# Altium integrated library Lattice CPLD ispLSI.IntLib: 471 symbols (part 14 of 26) (continued)
## ispLSI3160-125LB272 (continued)
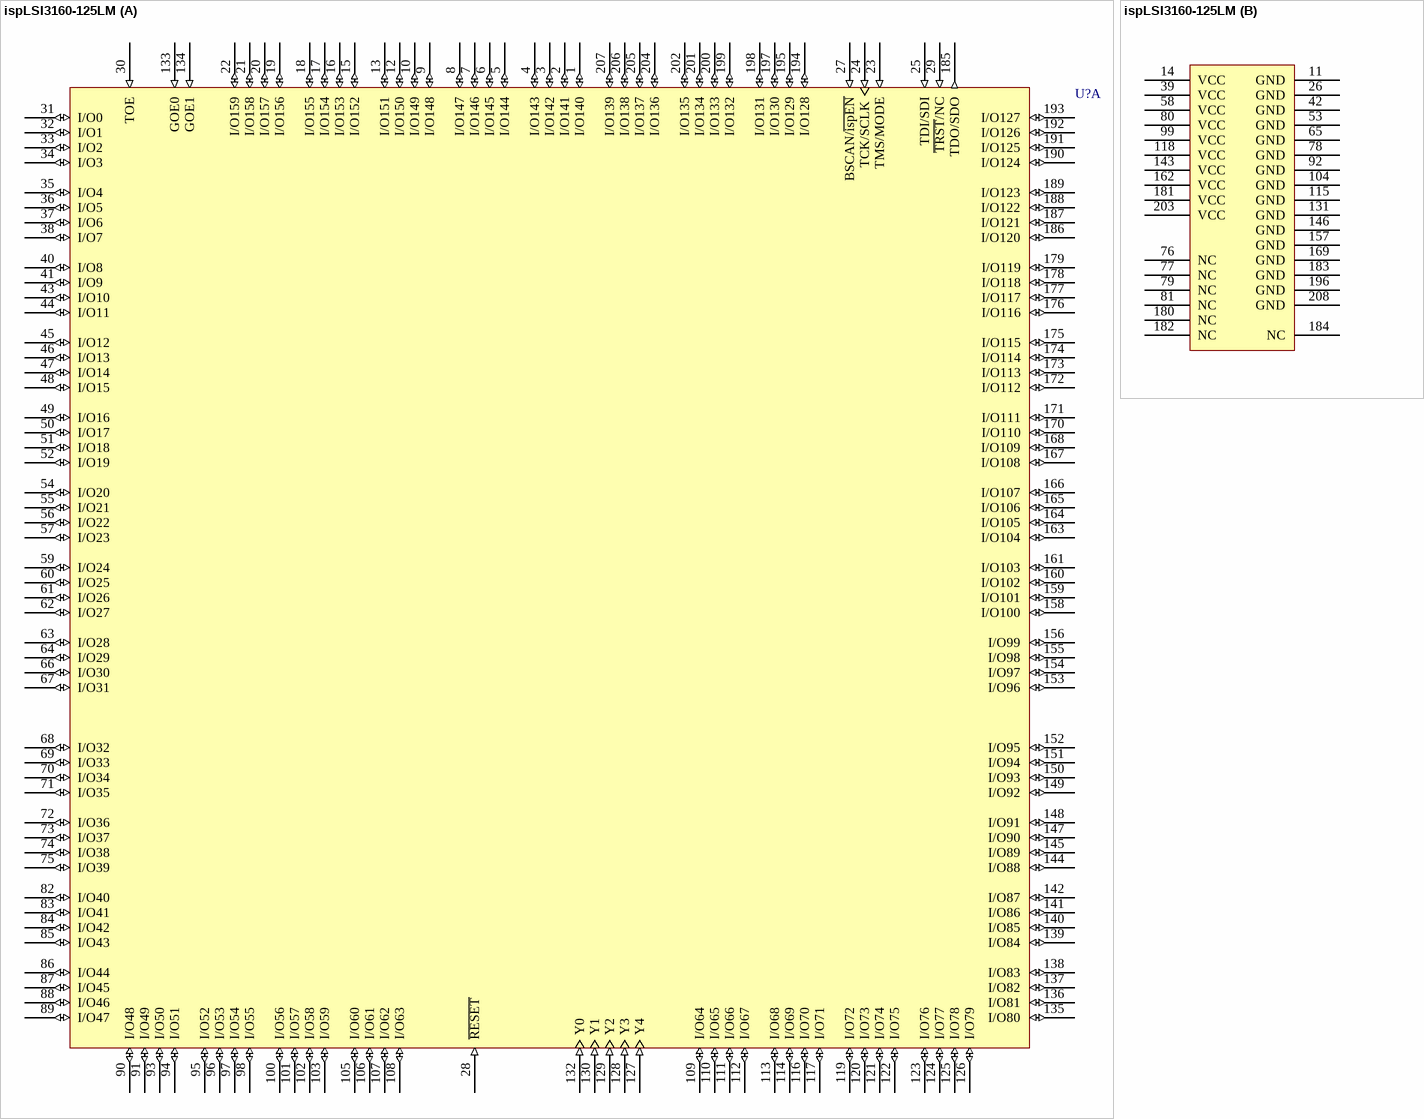
[diagram p123: symbol ispLSI3160-125LM]

## ispLSI3160-125LM
designator U?
In-System Programmable High-Density PLD; Published: 23-Sep-2002; LatestRevisionDate: 13-Apr-2006; LatestRevisionNote: IPC-7351 Footprint Added.; DatasheetVersion: May-1999; PackageVersion: Sep-2000; PackageReference: MQFP208; Publisher: Altium Limited; PackageDescription: 208-Pin Shrink Quad Flat Pack 0.5 mm Pitch; ComponentLink1Description: Manufacturer Link; ComponentLink1URL: http://www.latticesemi.com/products/mature/index.cfm; ComponentLink2Description: Datasheet; ComponentLink2URL: http://www.latticesemi.com/lit/docs/datasheets/cpld/3160.pdf
footprint MQFP208_N (Shrink QFP, 208-Leads, Body 27.7x27.7mm, Pitch 0.5mm, IPC Medium Density)
footprint MQFP208_L (Shrink QFP, 208-Leads, Body 27.7x27.7mm, Pitch 0.5mm, IPC High Density)
footprint MQFP208_M (Shrink QFP, 208-Leads, Body 27.7x27.7mm, Pitch 0.5mm, IPC Low Density)
3D model 3160-MQFP208 (208-Pin Shrink Quad Flat Pack 0.5 mm Pitch)
part A pins: 1 I/O140 (io), 2 I/O141 (io), 3 I/O142 (io), 4 I/O143 (io), 5 I/O144 (io), 6 I/O145 (io), 7 I/O146 (io), 8 I/O147 (io), 9 I/O148 (io), 10 I/O149 (io), 12 I/O150 (io), 13 I/O151 (io), 15 I/O152 (io), 16 I/O153 (io), 17 I/O154 (io), 18 I/O155 (io), 19 I/O156 (io), 20 I/O157 (io), 21 I/O158 (io), 22 I/O159 (io), 23 TMS/MODE (in), 24 TCK/SCLK (in), 25 TDI/SDI (in), 27 BSCAN/~{ispEN} (in), 28 ~{RESET} (in), 29 ~{TRST}/NC (in), 30 TOE (in), 31 I/O0 (io), 32 I/O1 (io), 33 I/O2 (io), 34 I/O3 (io), 35 I/O4 (io), 36 I/O5 (io), 37 I/O6 (io), 38 I/O7 (io), 40 I/O8 (io), 41 I/O9 (io), 43 I/O10 (io), 44 I/O11 (io), 45 I/O12 (io), 46 I/O13 (io), 47 I/O14 (io), 48 I/O15 (io), 49 I/O16 (io), 50 I/O17 (io), 51 I/O18 (io), 52 I/O19 (io), 54 I/O20 (io), 55 I/O21 (io), 56 I/O22 (io), 57 I/O23 (io), 59 I/O24 (io), 60 I/O25 (io), 61 I/O26 (io), 62 I/O27 (io), 63 I/O28 (io), 64 I/O29 (io), 66 I/O30 (io), 67 I/O31 (io), 68 I/O32 (io), 69 I/O33 (io), 70 I/O34 (io), 71 I/O35 (io), 72 I/O36 (io), 73 I/O37 (io), 74 I/O38 (io), 75 I/O39 (io), 82 I/O40 (io), 83 I/O41 (io), 84 I/O42 (io), 85 I/O43 (io), 86 I/O44 (io), 87 I/O45 (io), 88 I/O46 (io), 89 I/O47 (io), 90 I/O48 (io), 91 I/O49 (io), 93 I/O50 (io), 94 I/O51 (io), 95 I/O52 (io), 96 I/O53 (io), 97 I/O54 (io), 98 I/O55 (io), 100 I/O56 (io), 101 I/O57 (io), 102 I/O58 (io), 103 I/O59 (io), 105 I/O60 (io), 106 I/O61 (io), 107 I/O62 (io), 108 I/O63 (io), 109 I/O64 (io), 110 I/O65 (io), 111 I/O66 (io), 112 I/O67 (io), 113 I/O68 (io), 114 I/O69 (io), 116 I/O70 (io), 117 I/O71 (io), 119 I/O72 (io), 120 I/O73 (io), 121 I/O74 (io), 122 I/O75 (io), 123 I/O76 (io), 124 I/O77 (io), 125 I/O78 (io), 126 I/O79 (io), 127 Y4 (in), 128 Y3 (in), 129 Y2 (in), 130 Y1 (in), 132 Y0 (in), 133 GOE0 (in), 134 GOE1 (in), 135 I/O80 (io), 136 I/O81 (io), 137 I/O82 (io), 138 I/O83 (io), 139 I/O84 (io), 140 I/O85 (io), 141 I/O86 (io), 142 I/O87 (io), 144 I/O88 (io), 145 I/O89 (io), 147 I/O90 (io), 148 I/O91 (io), 149 I/O92 (io), 150 I/O93 (io), 151 I/O94 (io), 152 I/O95 (io), 153 I/O96 (io), 154 I/O97 (io), 155 I/O98 (io), 156 I/O99 (io), 158 I/O100 (io), 159 I/O101 (io), 160 I/O102 (io), 161 I/O103 (io), 163 I/O104 (io), 164 I/O105 (io), 165 I/O106 (io), 166 I/O107 (io), 167 I/O108 (io), 168 I/O109 (io), 170 I/O110 (io), 171 I/O111 (io), 172 I/O112 (io), 173 I/O113 (io), 174 I/O114 (io), 175 I/O115 (io), 176 I/O116 (io), 177 I/O117 (io), 178 I/O118 (io), 179 I/O119 (io), 185 TDO/SDO (out), 186 I/O120 (io), 187 I/O121 (io), 188 I/O122 (io), 189 I/O123 (io), 190 I/O124 (io), 191 I/O125 (io), 192 I/O126 (io), 193 I/O127 (io), 194 I/O128 (io), 195 I/O129 (io), 197 I/O130 (io), 198 I/O131 (io), 199 I/O132 (io), 200 I/O133 (io), 201 I/O134 (io), 202 I/O135 (io), 204 I/O136 (io), 205 I/O137 (io), 206 I/O138 (io), 207 I/O139 (io)
part B pins: 11 GND (power), 14 VCC (power), 26 GND (power), 39 VCC (power), 42 GND (power), 53 GND (power), 58 VCC (power), 65 GND (power), 76 NC, 77 NC, 78 GND (power), 79 NC, 80 VCC (power), 81 NC, 92 GND (power), 99 VCC (power), 104 GND (power), 115 GND (power), 118 VCC (power), 131 GND (power), 143 VCC (power), 146 GND (power), 157 GND (power), 162 VCC (power), 169 GND (power), 180 NC, 181 VCC (power), 182 NC, 183 GND (power), 184 NC, 196 GND (power), 203 VCC (power), 208 GND (power)

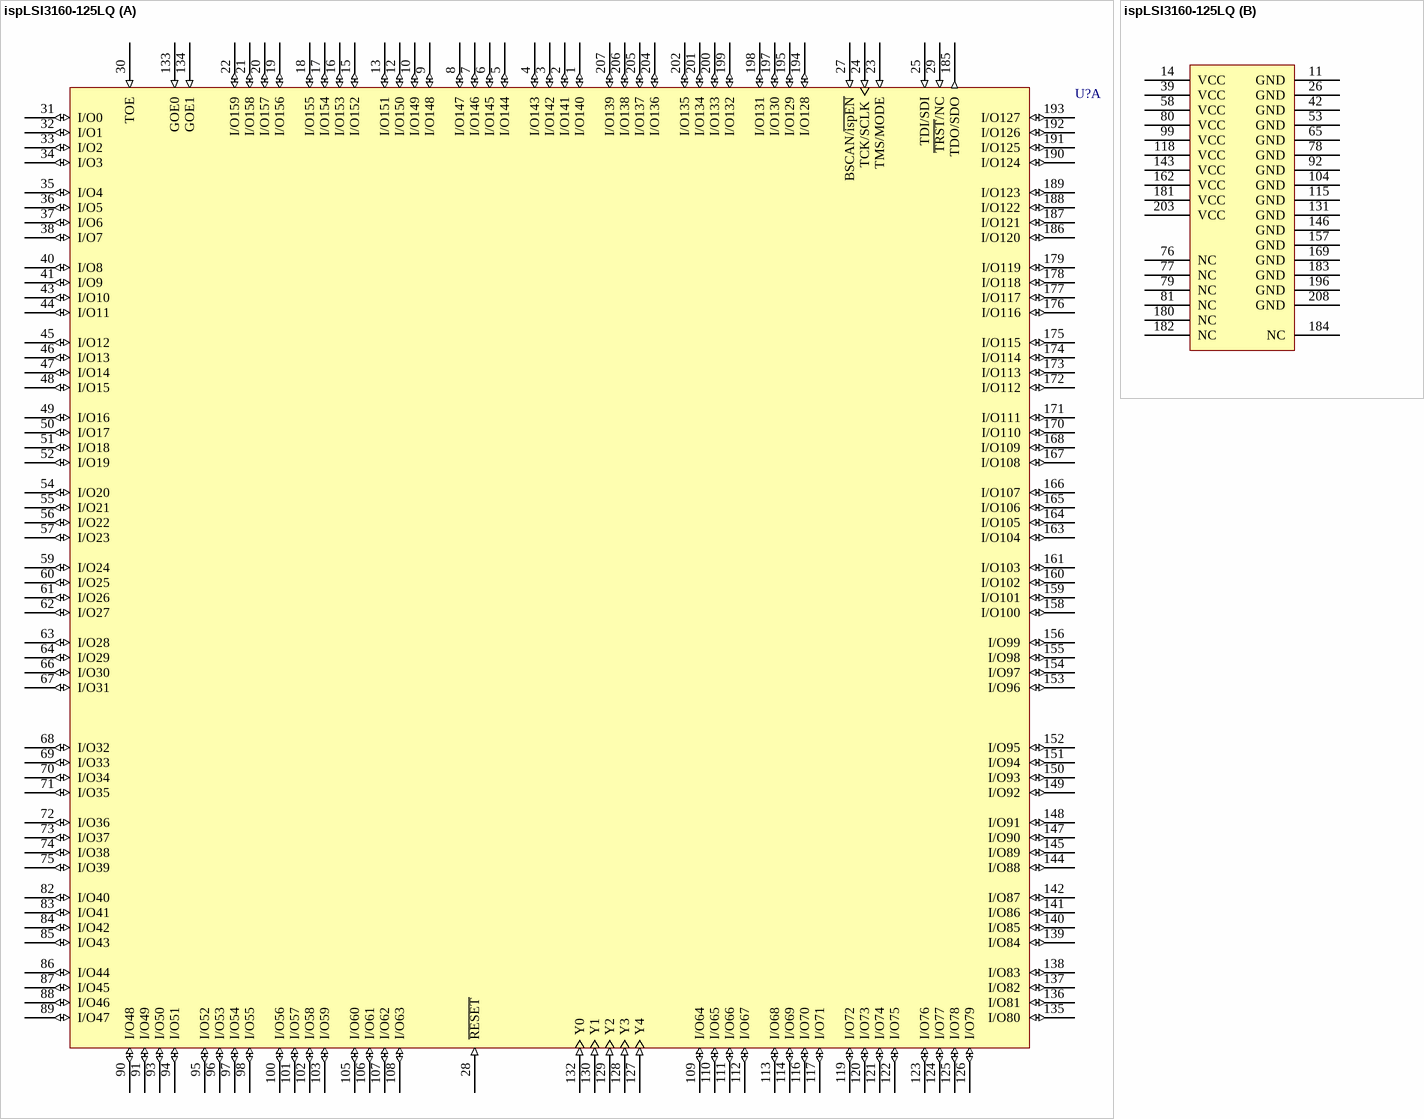
[diagram p124: symbol ispLSI3160-125LQ]

## ispLSI3160-125LQ
designator U?
In-System Programmable High-Density PLD; Published: 23-Sep-2002; LatestRevisionDate: 13-Apr-2006; LatestRevisionNote: IPC-7351 Footprint Added.; DatasheetVersion: May-1999; PackageVersion: pkg_32, Aug-2005; PackageReference: PQFP208; Publisher: Altium Limited; PackageDescription: 208-Pin Plastic Quad Flat Pack (PQFP208); Code_JEDEC: MO-143-FAI; ComponentLink1Description: Manufacturer Link; ComponentLink1URL: http://www.latticesemi.com/products/mature/index.cfm; ComponentLink2Description: Datasheet; ComponentLink2URL: http://www.latticesemi.com/lit/docs/datasheets/cpld/3160.pdf
footprint PQFP208_N (Shrink QFP, 208-Leads, Body 28x28mm, Pitch 0.5mm, IPC Medium Density)
footprint PQFP208_L (Shrink QFP, 208-Leads, Body 28x28mm, Pitch 0.5mm, IPC High Density)
footprint PQFP208_M (Shrink QFP, 208-Leads, Body 28x28mm, Pitch 0.5mm, IPC Low Density)
3D model 3160-PQFP208 (208-Pin Plastic Quad Flat Pack (PQFP208))
part A pins: 1 I/O140 (io), 2 I/O141 (io), 3 I/O142 (io), 4 I/O143 (io), 5 I/O144 (io), 6 I/O145 (io), 7 I/O146 (io), 8 I/O147 (io), 9 I/O148 (io), 10 I/O149 (io), 12 I/O150 (io), 13 I/O151 (io), 15 I/O152 (io), 16 I/O153 (io), 17 I/O154 (io), 18 I/O155 (io), 19 I/O156 (io), 20 I/O157 (io), 21 I/O158 (io), 22 I/O159 (io), 23 TMS/MODE (in), 24 TCK/SCLK (in), 25 TDI/SDI (in), 27 BSCAN/~{ispEN} (in), 28 ~{RESET} (in), 29 ~{TRST}/NC (in), 30 TOE (in), 31 I/O0 (io), 32 I/O1 (io), 33 I/O2 (io), 34 I/O3 (io), 35 I/O4 (io), 36 I/O5 (io), 37 I/O6 (io), 38 I/O7 (io), 40 I/O8 (io), 41 I/O9 (io), 43 I/O10 (io), 44 I/O11 (io), 45 I/O12 (io), 46 I/O13 (io), 47 I/O14 (io), 48 I/O15 (io), 49 I/O16 (io), 50 I/O17 (io), 51 I/O18 (io), 52 I/O19 (io), 54 I/O20 (io), 55 I/O21 (io), 56 I/O22 (io), 57 I/O23 (io), 59 I/O24 (io), 60 I/O25 (io), 61 I/O26 (io), 62 I/O27 (io), 63 I/O28 (io), 64 I/O29 (io), 66 I/O30 (io), 67 I/O31 (io), 68 I/O32 (io), 69 I/O33 (io), 70 I/O34 (io), 71 I/O35 (io), 72 I/O36 (io), 73 I/O37 (io), 74 I/O38 (io), 75 I/O39 (io), 82 I/O40 (io), 83 I/O41 (io), 84 I/O42 (io), 85 I/O43 (io), 86 I/O44 (io), 87 I/O45 (io), 88 I/O46 (io), 89 I/O47 (io), 90 I/O48 (io), 91 I/O49 (io), 93 I/O50 (io), 94 I/O51 (io), 95 I/O52 (io), 96 I/O53 (io), 97 I/O54 (io), 98 I/O55 (io), 100 I/O56 (io), 101 I/O57 (io), 102 I/O58 (io), 103 I/O59 (io), 105 I/O60 (io), 106 I/O61 (io), 107 I/O62 (io), 108 I/O63 (io), 109 I/O64 (io), 110 I/O65 (io), 111 I/O66 (io), 112 I/O67 (io), 113 I/O68 (io), 114 I/O69 (io), 116 I/O70 (io), 117 I/O71 (io), 119 I/O72 (io), 120 I/O73 (io), 121 I/O74 (io), 122 I/O75 (io), 123 I/O76 (io), 124 I/O77 (io), 125 I/O78 (io), 126 I/O79 (io), 127 Y4 (in), 128 Y3 (in), 129 Y2 (in), 130 Y1 (in), 132 Y0 (in), 133 GOE0 (in), 134 GOE1 (in), 135 I/O80 (io), 136 I/O81 (io), 137 I/O82 (io), 138 I/O83 (io), 139 I/O84 (io), 140 I/O85 (io), 141 I/O86 (io), 142 I/O87 (io), 144 I/O88 (io), 145 I/O89 (io), 147 I/O90 (io), 148 I/O91 (io), 149 I/O92 (io), 150 I/O93 (io), 151 I/O94 (io), 152 I/O95 (io), 153 I/O96 (io), 154 I/O97 (io), 155 I/O98 (io), 156 I/O99 (io), 158 I/O100 (io), 159 I/O101 (io), 160 I/O102 (io), 161 I/O103 (io), 163 I/O104 (io), 164 I/O105 (io), 165 I/O106 (io), 166 I/O107 (io), 167 I/O108 (io), 168 I/O109 (io), 170 I/O110 (io), 171 I/O111 (io), 172 I/O112 (io), 173 I/O113 (io), 174 I/O114 (io), 175 I/O115 (io), 176 I/O116 (io), 177 I/O117 (io), 178 I/O118 (io), 179 I/O119 (io), 185 TDO/SDO (out), 186 I/O120 (io), 187 I/O121 (io), 188 I/O122 (io), 189 I/O123 (io), 190 I/O124 (io), 191 I/O125 (io), 192 I/O126 (io), 193 I/O127 (io), 194 I/O128 (io), 195 I/O129 (io), 197 I/O130 (io), 198 I/O131 (io), 199 I/O132 (io), 200 I/O133 (io), 201 I/O134 (io), 202 I/O135 (io), 204 I/O136 (io), 205 I/O137 (io), 206 I/O138 (io), 207 I/O139 (io)
part B pins: 11 GND (power), 14 VCC (power), 26 GND (power), 39 VCC (power), 42 GND (power), 53 GND (power), 58 VCC (power), 65 GND (power), 76 NC, 77 NC, 78 GND (power), 79 NC, 80 VCC (power), 81 NC, 92 GND (power), 99 VCC (power), 104 GND (power), 115 GND (power), 118 VCC (power), 131 GND (power), 143 VCC (power), 146 GND (power), 157 GND (power), 162 VCC (power), 169 GND (power), 180 NC, 181 VCC (power), 182 NC, 183 GND (power), 184 NC, 196 GND (power), 203 VCC (power), 208 GND (power)

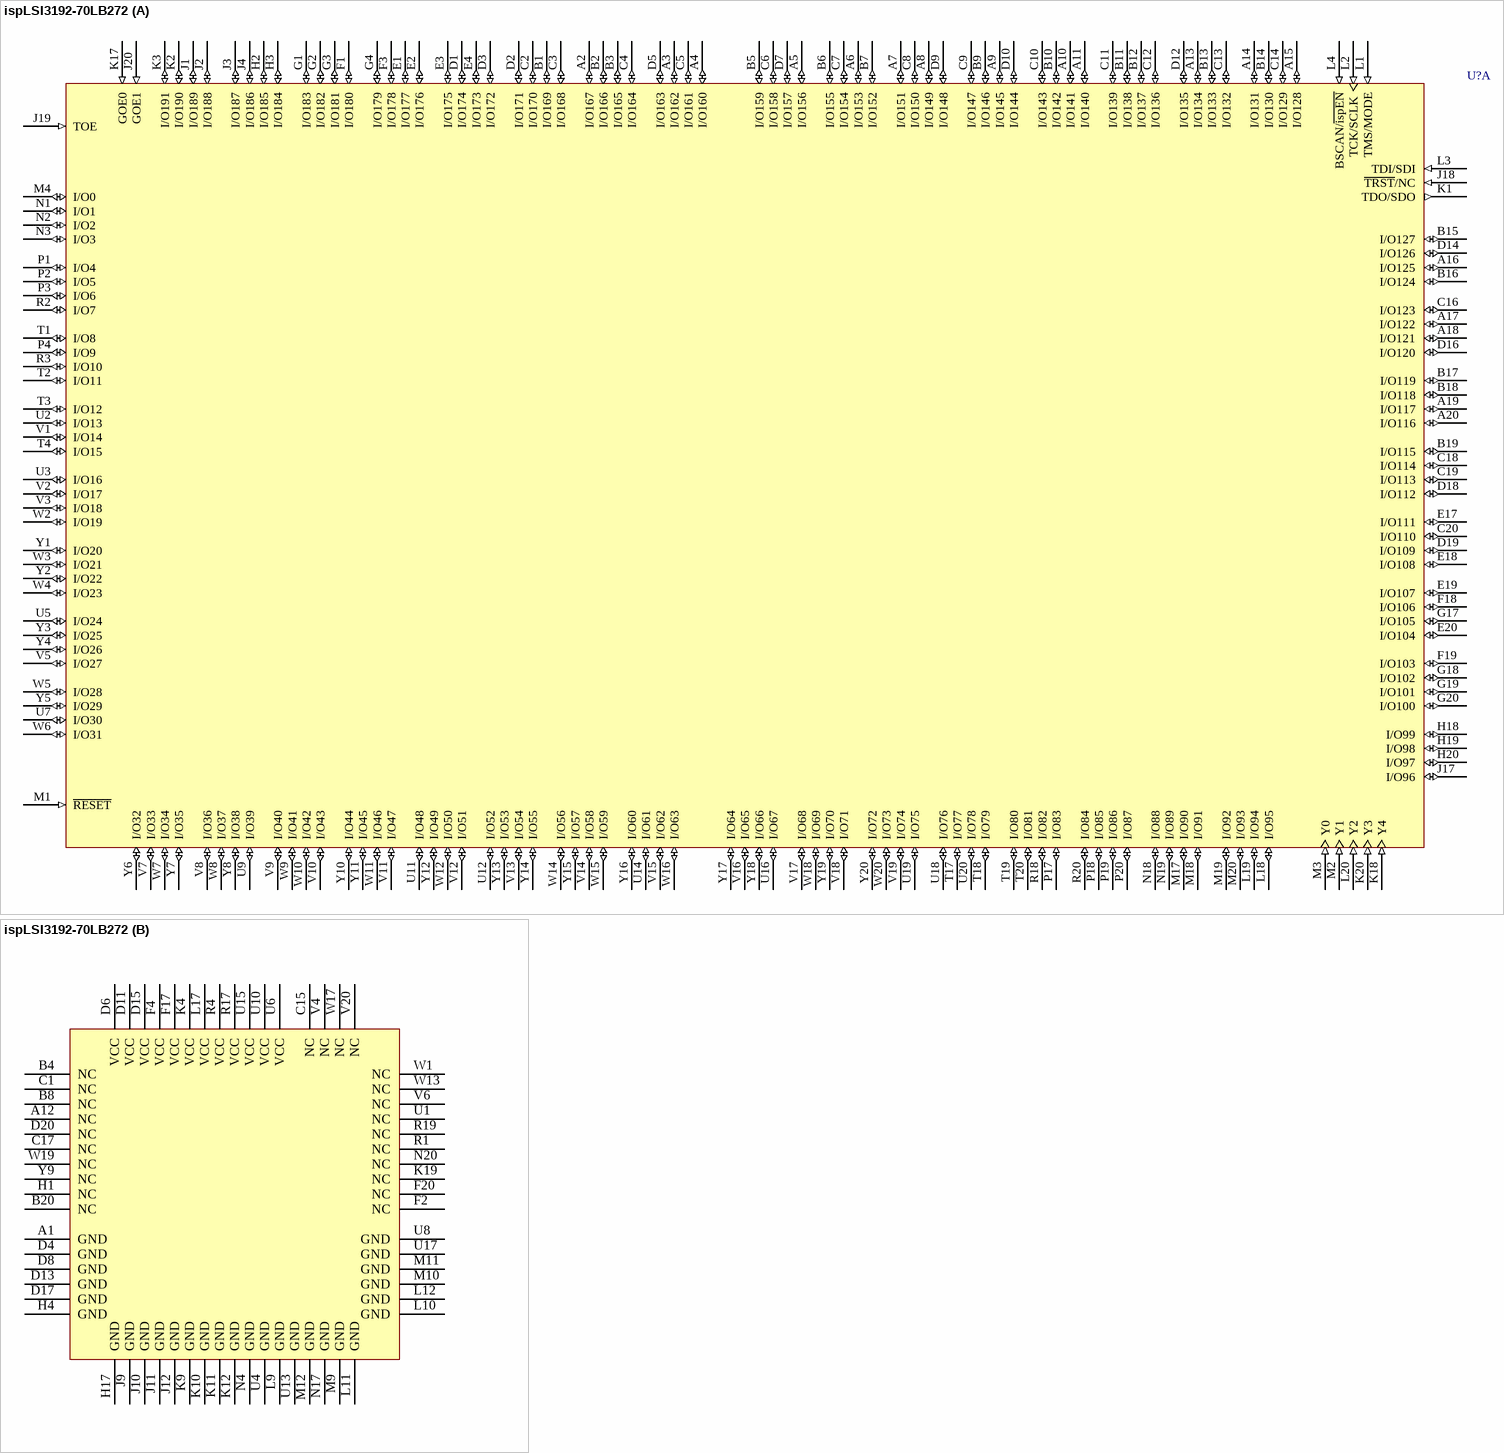
[diagram p125: symbol ispLSI3192-70LB272]

## ispLSI3192-70LB272
designator U?
High-Density Programmable Logic; Note: Pins J18, K1, L1, L2, L3 and L4 have dual function capability.; Published: 23-Sep-2002; LatestRevisionDate: 13-Apr-2006; LatestRevisionNote: IPC-7351 Footprint Added.; DatasheetVersion: May-1999; PackageVersion: pkg_32, Aug-2005; PackageReference: BGA272; Publisher: Altium Limited; PackageDescription: 272-Ball Ball Grid Array (BGA272); ComponentLink1Description: Manufacturer Link; ComponentLink1URL: http://www.latticesemi.com/products/mature/index.cfm; ComponentLink2Description: Datasheet; ComponentLink2URL: http://www.latticesemi.com/lit/docs/datasheets/cpld/3192.pdf
footprint BGA272 (BGA, 272-Leads, Body 27x27mm, Pitch 1.27mm)
3D model 3192-BGA272 (272-Ball Ball Grid Array (BGA272))
part A pins: A2 I/O167 (io), A3 I/O162 (io), A4 I/O160 (io), A5 I/O156 (io), A6 I/O153 (io), A7 I/O151 (io), A8 I/O149 (io), A9 I/O145 (io), A10 I/O141 (io), A11 I/O140 (io), A13 I/O134 (io), A14 I/O131 (io), A15 I/O128 (io), A16 I/O125 (io), A17 I/O122 (io), A18 I/O121 (io), A19 I/O117 (io), A20 I/O116 (io), B1 I/O169 (io), B2 I/O166 (io), B3 I/O165 (io), B5 I/O159 (io), B6 I/O155 (io), B7 I/O152 (io), B9 I/O146 (io), B10 I/O142 (io), B11 I/O138 (io), B12 I/O137 (io), B13 I/O133 (io), B14 I/O130 (io), B15 I/O127 (io), B16 I/O124 (io), B17 I/O119 (io), B18 I/O118 (io), B19 I/O115 (io), C2 I/O170 (io), C3 I/O168 (io), C4 I/O164 (io), C5 I/O161 (io), C6 I/O158 (io), C7 I/O154 (io), C8 I/O150 (io), C9 I/O147 (io), C10 I/O143 (io), C11 I/O139 (io), C12 I/O136 (io), C13 I/O132 (io), C14 I/O129 (io), C16 I/O123 (io), C18 I/O114 (io), C19 I/O113 (io), C20 I/O110 (io), D1 I/O174 (io), D2 I/O171 (io), D3 I/O172 (io), D5 I/O163 (io), D7 I/O157 (io), D9 I/O148 (io), D10 I/O144 (io), D12 I/O135 (io), D14 I/O126 (io), D16 I/O120 (io), D18 I/O112 (io), D19 I/O109 (io), E1 I/O177 (io), E2 I/O176 (io), E3 I/O175 (io), E4 I/O173 (io), E17 I/O111 (io), E18 I/O108 (io), E19 I/O107 (io), E20 I/O104 (io), F1 I/O180 (io), F3 I/O178 (io), F18 I/O106 (io), F19 I/O103 (io), G1 I/O183 (io), G2 I/O182 (io), G3 I/O181 (io), G4 I/O179 (io), G17 I/O105 (io), G18 I/O102 (io), G19 I/O101 (io), G20 I/O100 (io), H2 I/O185 (io), H3 I/O184 (io), H18 I/O99 (io), H19 I/O98 (io), H20 I/O97 (io), J1 I/O189 (io), J2 I/O188 (io), J3 I/O187 (io), J4 I/O186 (io), J17 I/O96 (io), J18 ~{TRST}/NC (in), J19 TOE (in), J20 GOE1 (in), K1 TDO/SDO (out), K2 I/O190 (io), K3 I/O191 (io), K17 GOE0 (in), K18 Y4 (in), K20 Y3 (in), L1 TMS/MODE (in), L2 TCK/SCLK (in), L3 TDI/SDI (in), L4 BSCAN/~{ispEN} (in), L18 I/O95 (io), L19 I/O94 (io), L20 Y2 (in), M1 ~{RESET} (in), M2 Y1 (in), M3 Y0 (in), M4 I/O0 (io), M17 I/O90 (io), M18 I/O91 (io), M19 I/O92 (io), M20 I/O93 (io), N1 I/O1 (io), N2 I/O2 (io), N3 I/O3 (io), N18 I/O88 (io), N19 I/O89 (io), P1 I/O4 (io), P2 I/O5 (io), P3 I/O6 (io), P4 I/O9 (io), P17 I/O83 (io), P18 I/O85 (io), P19 I/O86 (io), P20 I/O87 (io), R2 I/O7 (io), R3 I/O10 (io), R18 I/O82 (io), R20 I/O84 (io), T1 I/O8 (io), T2 I/O11 (io), T3 I/O12 (io), T4 I/O15 (io), T17 I/O77 (io), T18 I/O79 (io), T19 I/O80 (io), T20 I/O81 (io), U2 I/O13 (io), U3 I/O16 (io), U5 I/O24 (io), U7 I/O30 (io), U9 I/O39 (io), U11 I/O48 (io), U12 I/O52 (io), U14 I/O61 (io), U16 I/O67 (io), U18 I/O76 (io), U19 I/O75 (io), U20 I/O78 (io), V1 I/O14 (io), V2 I/O17 (io), V3 I/O18 (io), V5 I/O27 (io), V7 I/O33 (io), V8 I/O36 (io), V9 I/O40 (io), V10 I/O43 (io), V11 I/O47 (io), V12 I/O51 (io), V13 I/O54 (io), V14 I/O58 (io), V15 I/O62 (io), V16 I/O65 (io), V17 I/O68 (io), V18 I/O71 (io), V19 I/O74 (io), W2 I/O19 (io), W3 I/O21 (io), W4 I/O23 (io), W5 I/O28 (io), W6 I/O31 (io), W7 I/O34 (io), W8 I/O37 (io), W9 I/O41 (io), W10 I/O42 (io), W11 I/O46 (io), W12 I/O50 (io), W14 I/O56 (io), W15 I/O59 (io), W16 I/O63 (io), W18 I/O69 (io), W20 I/O73 (io), Y1 I/O20 (io), Y2 I/O22 (io), Y3 I/O25 (io), Y4 I/O26 (io), Y5 I/O29 (io), Y6 I/O32 (io), Y7 I/O35 (io), Y8 I/O38 (io), Y10 I/O44 (io), Y11 I/O45 (io), Y12 I/O49 (io), Y13 I/O53 (io), Y14 I/O55 (io), Y15 I/O57 (io), Y16 I/O60 (io), Y17 I/O64 (io), Y18 I/O66 (io), Y19 I/O70 (io), Y20 I/O72 (io)
part B pins: A1 GND (power), A12 NC, B4 NC, B8 NC, B20 NC, C1 NC, C15 NC, C17 NC, D4 GND (power), D6 VCC (power), D8 GND (power), D11 VCC (power), D13 GND (power), D15 VCC (power), D17 GND (power), D20 NC, F2 NC, F4 VCC (power), F17 VCC (power), F20 NC, H1 NC, H4 GND (power), H17 GND (power), J9 GND (power), J10 GND (power), J11 GND (power), J12 GND (power), K4 VCC (power), K9 GND (power), K10 GND (power), K11 GND (power), K12 GND (power), K19 NC, L9 GND (power), L10 GND (power), L11 GND (power), L12 GND (power), L17 VCC (power), M9 GND (power), M10 GND (power), M11 GND (power), M12 GND (power), N4 GND (power), N17 GND (power), N20 NC, R1 NC, R4 VCC (power), R17 VCC (power), R19 NC, U1 NC, U4 GND (power), U6 VCC (power), U8 GND (power), U10 VCC (power), U13 GND (power), U15 VCC (power), U17 GND (power), V4 NC, V6 NC, V20 NC, W1 NC, W13 NC, W17 NC, W19 NC, Y9 NC

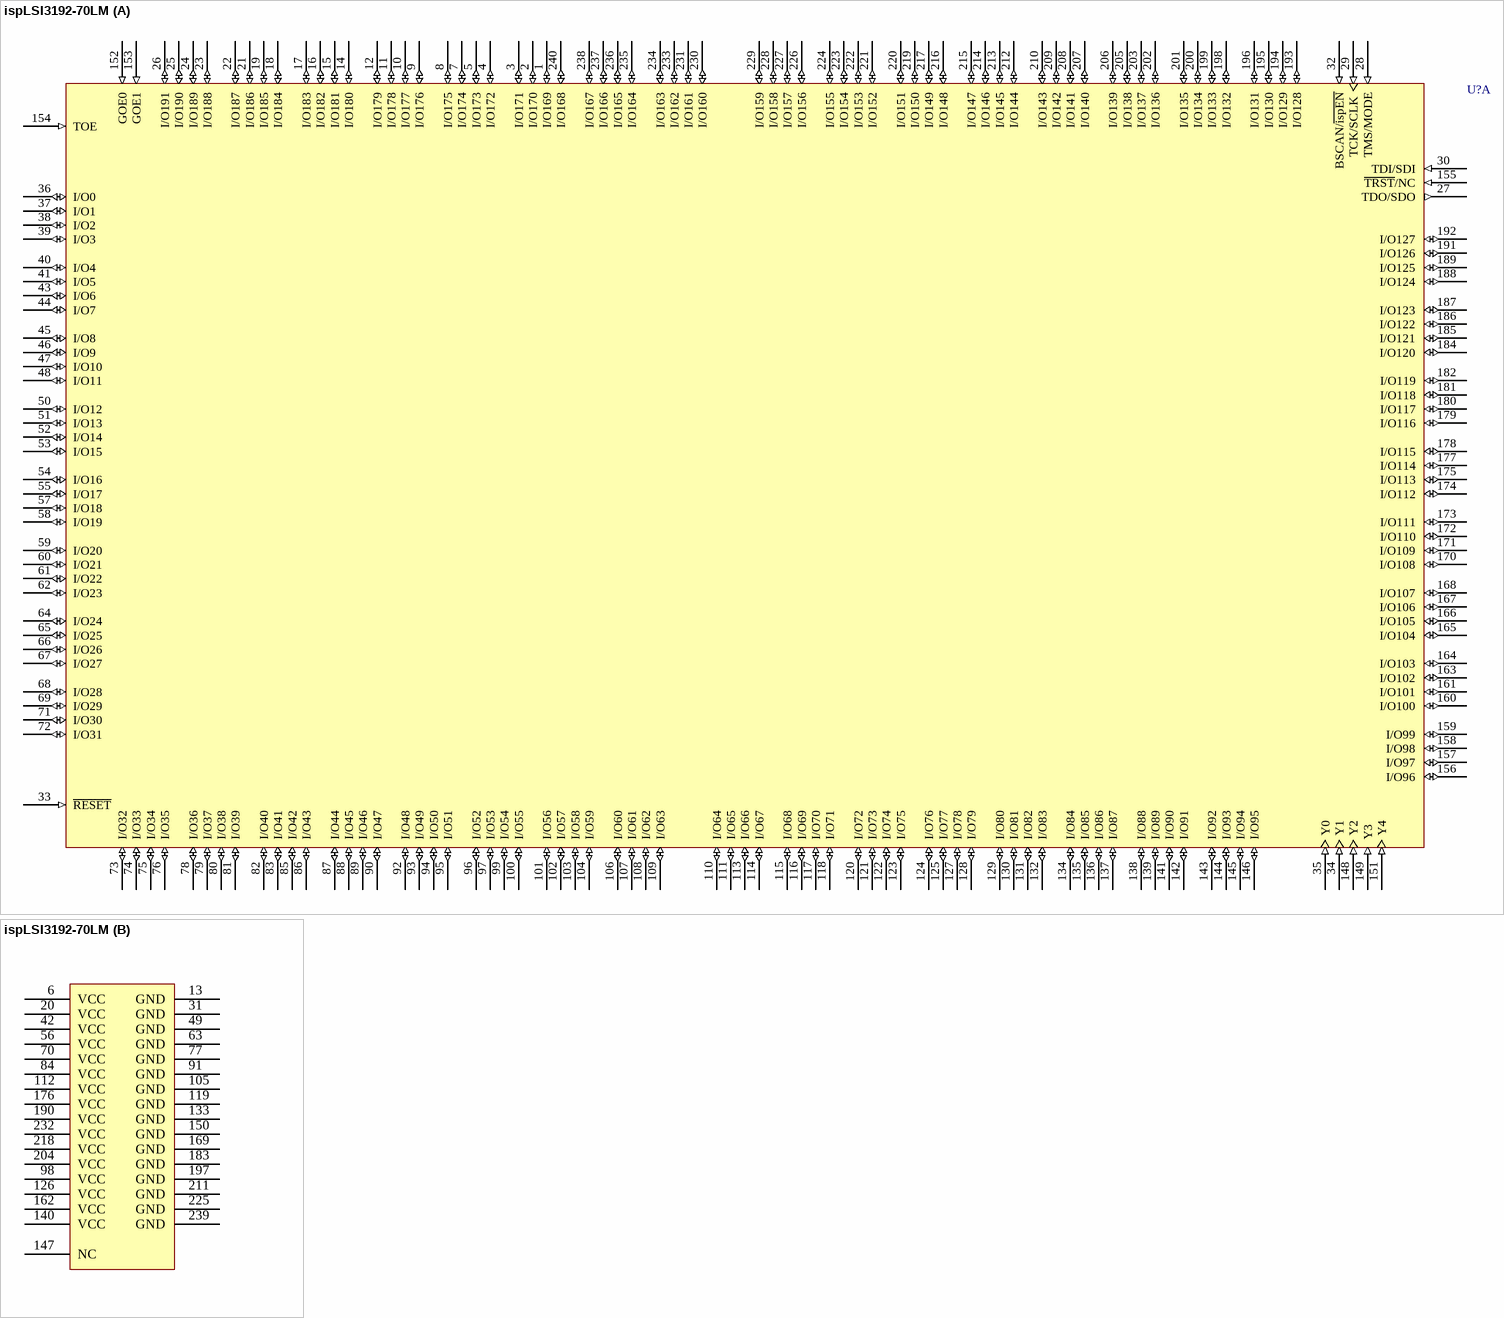
[diagram p126: symbol ispLSI3192-70LM]

## ispLSI3192-70LM
designator U?
High-Density Programmable Logic; Note: Pins 27, 28, 29, 30, 32 and 155 have dual function capability.; Published: 23-Sep-2002; LatestRevisionDate: 13-Apr-2006; LatestRevisionNote: IPC-7351 Footprint Added.; DatasheetVersion: May-1999; PackageVersion: pkg_32, Aug-2005; PackageReference: MQFP240; Publisher: Altium Limited; PackageDescription: 240-Pin Shrink Quad Flat Pack 0.5 mm Pitch; ComponentLink1Description: Manufacturer Link; ComponentLink1URL: http://www.latticesemi.com/products/mature/index.cfm; ComponentLink2Description: Datasheet; ComponentLink2URL: http://www.latticesemi.com/lit/docs/datasheets/cpld/3192.pdf
footprint MQFP240_N (Shrink QFP, 240-Leads, Body 31.7x31.7mm, Pitch 0.5mm, IPC Medium Density)
footprint MQFP240_L (Shrink QFP, 240-Leads, Body 31.7x31.7mm, Pitch 0.5mm, IPC High Density)
footprint MQFP240_M (Shrink QFP, 240-Leads, Body 31.7x31.7mm, Pitch 0.5mm, IPC Low Density)
3D model 3192-MQFP240 (240-Pin Shrink Quad Flat Pack 0.5 mm Pitch)
part A pins: 1 I/O169 (io), 2 I/O170 (io), 3 I/O171 (io), 4 I/O172 (io), 5 I/O173 (io), 7 I/O174 (io), 8 I/O175 (io), 9 I/O176 (io), 10 I/O177 (io), 11 I/O178 (io), 12 I/O179 (io), 14 I/O180 (io), 15 I/O181 (io), 16 I/O182 (io), 17 I/O183 (io), 18 I/O184 (io), 19 I/O185 (io), 21 I/O186 (io), 22 I/O187 (io), 23 I/O188 (io), 24 I/O189 (io), 25 I/O190 (io), 26 I/O191 (io), 27 TDO/SDO (out), 28 TMS/MODE (in), 29 TCK/SCLK (in), 30 TDI/SDI (in), 32 BSCAN/~{ispEN} (in), 33 ~{RESET} (in), 34 Y1 (in), 35 Y0 (in), 36 I/O0 (io), 37 I/O1 (io), 38 I/O2 (io), 39 I/O3 (io), 40 I/O4 (io), 41 I/O5 (io), 43 I/O6 (io), 44 I/O7 (io), 45 I/O8 (io), 46 I/O9 (io), 47 I/O10 (io), 48 I/O11 (io), 50 I/O12 (io), 51 I/O13 (io), 52 I/O14 (io), 53 I/O15 (io), 54 I/O16 (io), 55 I/O17 (io), 57 I/O18 (io), 58 I/O19 (io), 59 I/O20 (io), 60 I/O21 (io), 61 I/O22 (io), 62 I/O23 (io), 64 I/O24 (io), 65 I/O25 (io), 66 I/O26 (io), 67 I/O27 (io), 68 I/O28 (io), 69 I/O29 (io), 71 I/O30 (io), 72 I/O31 (io), 73 I/O32 (io), 74 I/O33 (io), 75 I/O34 (io), 76 I/O35 (io), 78 I/O36 (io), 79 I/O37 (io), 80 I/O38 (io), 81 I/O39 (io), 82 I/O40 (io), 83 I/O41 (io), 85 I/O42 (io), 86 I/O43 (io), 87 I/O44 (io), 88 I/O45 (io), 89 I/O46 (io), 90 I/O47 (io), 92 I/O48 (io), 93 I/O49 (io), 94 I/O50 (io), 95 I/O51 (io), 96 I/O52 (io), 97 I/O53 (io), 99 I/O54 (io), 100 I/O55 (io), 101 I/O56 (io), 102 I/O57 (io), 103 I/O58 (io), 104 I/O59 (io), 106 I/O60 (io), 107 I/O61 (io), 108 I/O62 (io), 109 I/O63 (io), 110 I/O64 (io), 111 I/O65 (io), 113 I/O66 (io), 114 I/O67 (io), 115 I/O68 (io), 116 I/O69 (io), 117 I/O70 (io), 118 I/O71 (io), 120 I/O72 (io), 121 I/O73 (io), 122 I/O74 (io), 123 I/O75 (io), 124 I/O76 (io), 125 I/O77 (io), 127 I/O78 (io), 128 I/O79 (io), 129 I/O80 (io), 130 I/O81 (io), 131 I/O82 (io), 132 I/O83 (io), 134 I/O84 (io), 135 I/O85 (io), 136 I/O86 (io), 137 I/O87 (io), 138 I/O88 (io), 139 I/O89 (io), 141 I/O90 (io), 142 I/O91 (io), 143 I/O92 (io), 144 I/O93 (io), 145 I/O94 (io), 146 I/O95 (io), 148 Y2 (in), 149 Y3 (in), 151 Y4 (in), 152 GOE0 (in), 153 GOE1 (in), 154 TOE (in), 155 ~{TRST}/NC (in), 156 I/O96 (io), 157 I/O97 (io), 158 I/O98 (io), 159 I/O99 (io), 160 I/O100 (io), 161 I/O101 (io), 163 I/O102 (io), 164 I/O103 (io), 165 I/O104 (io), 166 I/O105 (io), 167 I/O106 (io), 168 I/O107 (io), 170 I/O108 (io), 171 I/O109 (io), 172 I/O110 (io), 173 I/O111 (io), 174 I/O112 (io), 175 I/O113 (io), 177 I/O114 (io), 178 I/O115 (io), 179 I/O116 (io), 180 I/O117 (io), 181 I/O118 (io), 182 I/O119 (io), 184 I/O120 (io), 185 I/O121 (io), 186 I/O122 (io), 187 I/O123 (io), 188 I/O124 (io), 189 I/O125 (io), 191 I/O126 (io), 192 I/O127 (io), 193 I/O128 (io), 194 I/O129 (io), 195 I/O130 (io), 196 I/O131 (io), 198 I/O132 (io), 199 I/O133 (io), 200 I/O134 (io), 201 I/O135 (io), 202 I/O136 (io), 203 I/O137 (io), 205 I/O138 (io), 206 I/O139 (io), 207 I/O140 (io), 208 I/O141 (io), 209 I/O142 (io), 210 I/O143 (io), 212 I/O144 (io), 213 I/O145 (io), 214 I/O146 (io), 215 I/O147 (io), 216 I/O148 (io), 217 I/O149 (io), 219 I/O150 (io), 220 I/O151 (io), 221 I/O152 (io), 222 I/O153 (io), 223 I/O154 (io), 224 I/O155 (io), 226 I/O156 (io), 227 I/O157 (io), 228 I/O158 (io), 229 I/O159 (io), 230 I/O160 (io), 231 I/O161 (io), 233 I/O162 (io), 234 I/O163 (io), 235 I/O164 (io), 236 I/O165 (io), 237 I/O166 (io), 238 I/O167 (io), 240 I/O168 (io)
part B pins: 6 VCC (power), 13 GND (power), 20 VCC (power), 31 GND (power), 42 VCC (power), 49 GND (power), 56 VCC (power), 63 GND (power), 70 VCC (power), 77 GND (power), 84 VCC (power), 91 GND (power), 98 VCC (power), 105 GND (power), 112 VCC (power), 119 GND (power), 126 VCC (power), 133 GND (power), 140 VCC (power), 147 NC, 150 GND (power), 162 VCC (power), 169 GND (power), 176 VCC (power), 183 GND (power), 190 VCC (power), 197 GND (power), 204 VCC (power), 211 GND (power), 218 VCC (power), 225 GND (power), 232 VCC (power), 239 GND (power)

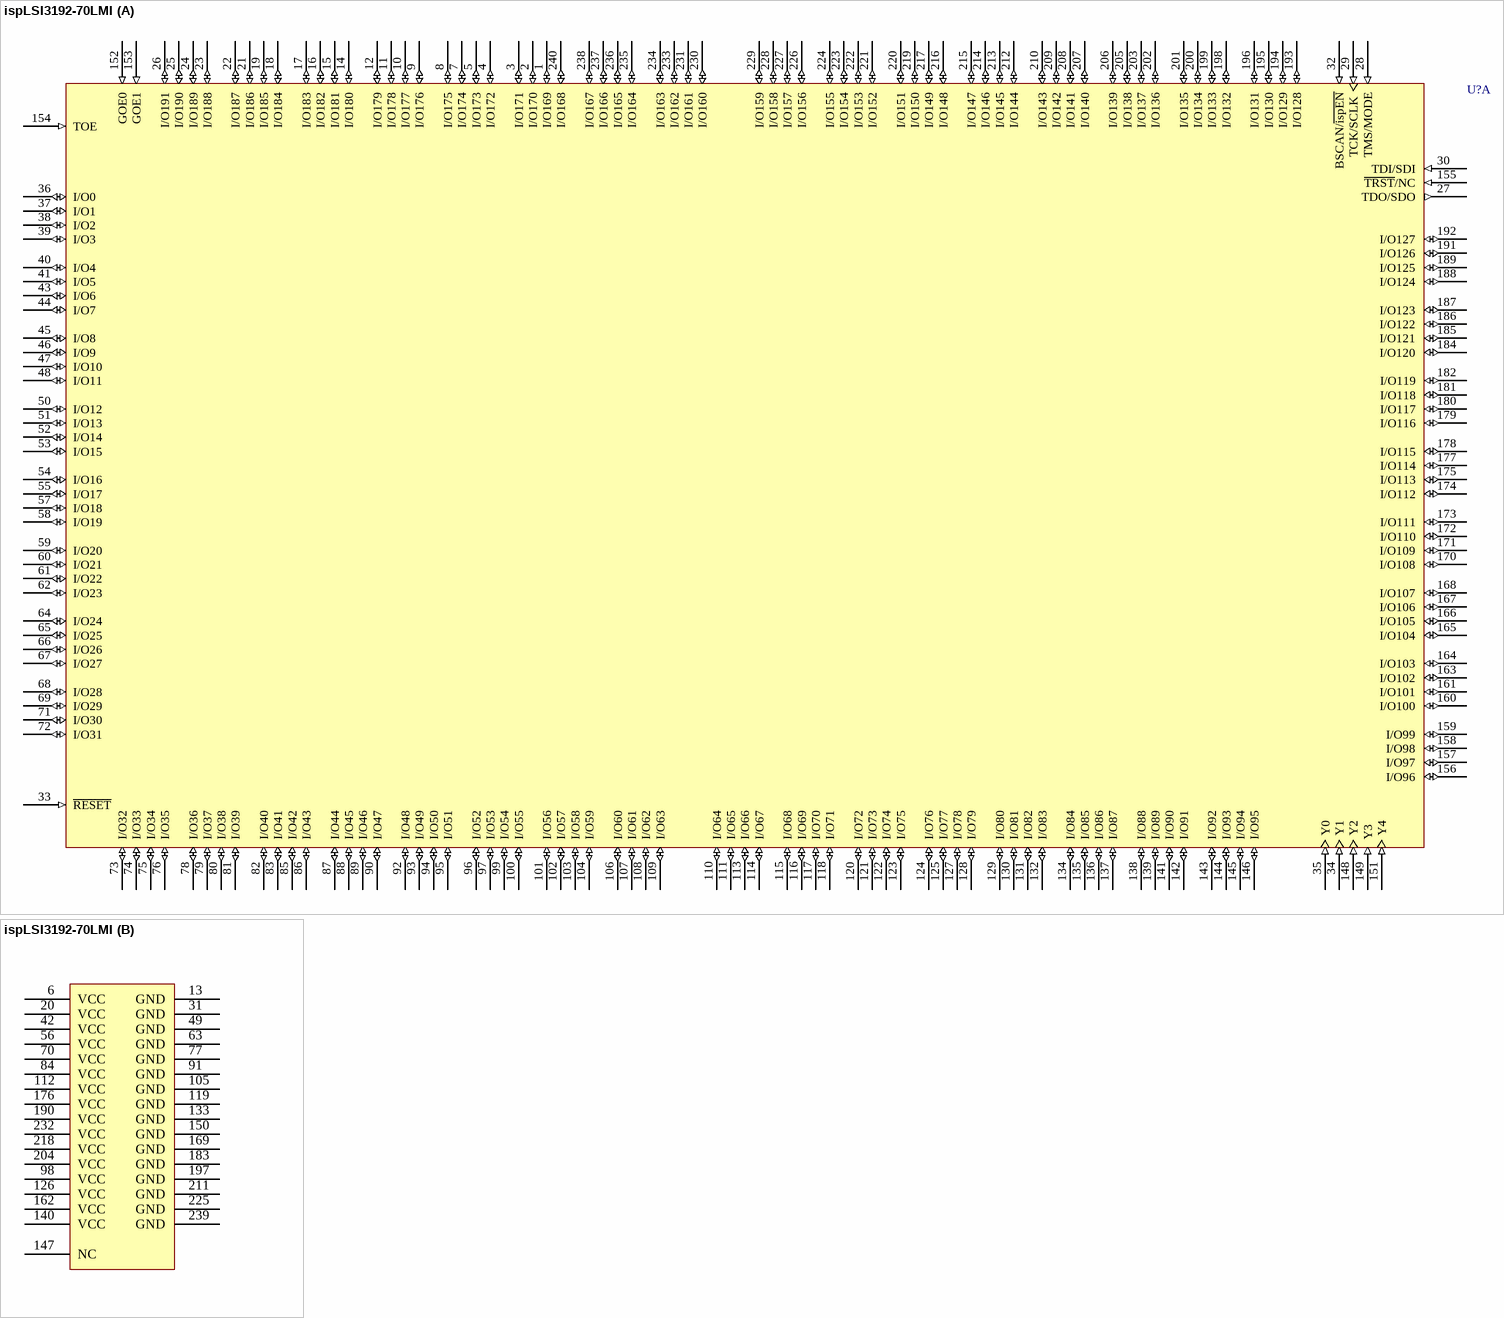
[diagram p127: symbol ispLSI3192-70LMI]